# Altium footprint library DCDCv1.1.PcbLib: 114 footprints (part 8 of 8)
Each footprint in its own frame and in the unit in brackets; x right, y up, seen from the top. Pads: shape width x height; smd on the part's side, far side on the other; paste and mask are expansions set on the pad; w line width, h text height; cw(c..) or ccw(c..) is an arc to the next point about the centre after c.
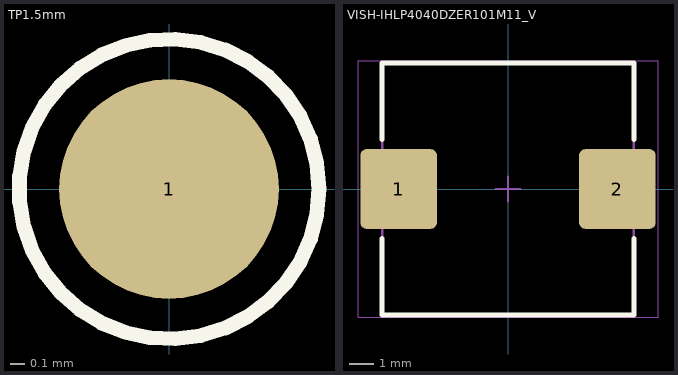
[diagram p7: the footprints below, top view; thin cyan lines are the x and y axes]

## TP1.5mm [mm] "Tent Point 1.5mm round"
pads (1):
  round 1.5 smd: 1(0,0)
Top Overlay:
  circle w0.1: c0,0 r1.024

## VISH-IHLP4040DZER101M11_V [mm]
pads (2):
  rrect15% 3.124x3.251 smd: 1(-4.47,0) 2(4.471,0)
Top Overlay:
  lines w0.2: -5.15,-2.026 -5.15,-5.15 5.15,-5.15 5.15,-2.026 ; -5.15,2.026 -5.15,5.15 5.15,5.15 5.15,2.026
Mechanical 13:
  lines w0.1: -5.15,-5.15 -5.15,5.15 5.15,5.15 5.15,-5.15 -5.15,-5.15
Mechanical 15:
  lines w0.05: -6.132,-5.25 -6.132,5.25 6.132,5.25 6.132,-5.25 -6.132,-5.25
  lines w0.1: -0.5,0 0.5,0 ; 0,-0.5 0,0.5
3D body "INDM103103X40L.step": height 4, standoff 0, extent -5.37,-5.15 5.37,5.15